# Altium integrated library Altium_WR-TBL_Rising Cage Clamp (rev25a).IntLib: 435 symbols (part 1 of 3) (continued)
## 691214300002
designator J?
WR-TBL Series 2143 Vertical Entry Modular, THT, pitch 3.81mm, 02p; Manufacturer: Wurth Elektronik; Modularity: Yes; Rated Current: 10A; System: Rising Cage Clamp; Working Voltage: 300V; Manufacturer Part Number: 691214300002; Category: Terminal Block; Match Code: WR-TBL; ComponentLink1Description: Website Link; ComponentLink1URL: https://www.we-online.com/redexpert/article/691214300002?ad; ComponentLink2Description: Datasheet Link; ComponentLink2URL: https://www.we-online.com/redexpert/spec/691214300002?ad; Mount: Through Hole; Min Operating Temperature: -30°C; Max Operating Temperature: 120°C; Packaging: Box; Application: Rising Cage Clamp; Number of Pins: 2; Number of Rows: 1; Orientation: Vertical; Pitch: 3.81mm
footprint 691214300002
pins: 1, 2

## 691214300003
designator J?
WR-TBL Series 2143 Vertical Entry Modular, THT, pitch 3.81mm, 03p; Manufacturer: Wurth Elektronik; Modularity: Yes; Rated Current: 10A; System: Rising Cage Clamp; Working Voltage: 300V; Manufacturer Part Number: 691214300003; Category: Terminal Block; Match Code: WR-TBL; ComponentLink1Description: Website Link; ComponentLink1URL: https://www.we-online.com/redexpert/article/691214300003?ad; ComponentLink2Description: Datasheet Link; ComponentLink2URL: https://www.we-online.com/redexpert/spec/691214300003?ad; Mount: Through Hole; Min Operating Temperature: -30°C; Max Operating Temperature: 120°C; Packaging: Box; Application: Rising Cage Clamp; Number of Pins: 3; Number of Rows: 1; Orientation: Vertical; Pitch: 3.81mm
footprint 691214300003
pins: 1, 2, 3

## 691214310002
designator J?
WR-TBL Series 2143 Horizontal Entry Modular, THT, pitch 3.81mm, 02p; Manufacturer: Wurth Elektronik; Modularity: Yes; Rated Current: 10A; System: Rising Cage Clamp; Working Voltage: 300V; Manufacturer Part Number: 691214310002; Category: Terminal Block; Match Code: WR-TBL; ComponentLink1Description: Website Link; ComponentLink1URL: https://www.we-online.com/redexpert/article/691214310002?ad; ComponentLink2Description: Datasheet Link; ComponentLink2URL: https://www.we-online.com/redexpert/spec/691214310002?ad; Mount: Through Hole; Min Operating Temperature: -40°C; Max Operating Temperature: 105°C; Packaging: Box; Application: Rising Cage Clamp; Number of Pins: 2; Number of Rows: 1; Orientation: Horizontal; Pitch: 3.81mm
footprint 691214310002
pins: 1, 2

## 691214310003
designator J?
WR-TBL Series 2143 Horizontal Entry Modular, THT, pitch 3.81mm, 03p; Manufacturer: Wurth Elektronik; Modularity: Yes; Rated Current: 10A; System: Rising Cage Clamp; Working Voltage: 300V; Manufacturer Part Number: 691214310003; Category: Terminal Block; Match Code: WR-TBL; ComponentLink1Description: Website Link; ComponentLink1URL: https://www.we-online.com/redexpert/article/691214310003?ad; ComponentLink2Description: Datasheet Link; ComponentLink2URL: https://www.we-online.com/redexpert/spec/691214310003?ad; Mount: Through Hole; Min Operating Temperature: -40°C; Max Operating Temperature: 105°C; Packaging: Box; Application: Rising Cage Clamp; Number of Pins: 3; Number of Rows: 1; Orientation: Horizontal; Pitch: 3.81mm
footprint 691214310003
pins: 1, 2, 3

## 691214400001
designator J?
WR-TBL Series 2144 Vertical Cable Entry, THT, pitch 7.62mm, 01p; Manufacturer: Wurth Elektronik; Modularity: Yes; Rated Current: 10A; System: Rising Cage Clamp; Working Voltage: 300V; Manufacturer Part Number: 691214400001; Category: Terminal Block; Match Code: WR-TBL; ComponentLink1Description: Website Link; ComponentLink1URL: https://www.we-online.com/redexpert/article/691214400001?ad; ComponentLink2Description: Datasheet Link; ComponentLink2URL: https://www.we-online.com/redexpert/spec/691214400001?ad; Mount: Through Hole; Min Operating Temperature: -30°C; Max Operating Temperature: 120°C; Packaging: Box; Application: Rising Cage Clamp; Number of Pins: 1; Number of Rows: 1; Orientation: Vertical; Pitch: 7.62mm
footprint 691214400001
pins: 1

## 691214400002
designator J?
WR-TBL Series 2144 Vertical Cable Entry, THT, pitch 7.62mm, 02p; Manufacturer: Wurth Elektronik; Modularity: Yes; Rated Current: 10A; System: Rising Cage Clamp; Working Voltage: 300V; Manufacturer Part Number: 691214400002; Category: Terminal Block; Match Code: WR-TBL; ComponentLink1Description: Website Link; ComponentLink1URL: https://www.we-online.com/redexpert/article/691214400002?ad; ComponentLink2Description: Datasheet Link; ComponentLink2URL: https://www.we-online.com/redexpert/spec/691214400002?ad; Mount: Through Hole; Min Operating Temperature: -30°C; Max Operating Temperature: 120°C; Packaging: Box; Application: Rising Cage Clamp; Number of Pins: 2; Number of Rows: 1; Orientation: Vertical; Pitch: 7.62mm
footprint 691214400002
pins: 1, 2

## 691214400101
designator J?
WR-TBL Series 2144 Vertical Cable Entry, THT, pitch 7.62mm, 01p; Manufacturer: Wurth Elektronik; Modularity: Yes; Rated Current: 10A; System: Rising Cage Clamp; Working Voltage: 300V; Manufacturer Part Number: 691214400101; Category: Terminal Block; Match Code: WR-TBL; ComponentLink1Description: Website Link; ComponentLink1URL: https://www.we-online.com/redexpert/article/691214400101?ad; ComponentLink2Description: Datasheet Link; ComponentLink2URL: https://www.we-online.com/redexpert/spec/691214400101?ad; Mount: Through Hole; Min Operating Temperature: -30°C; Max Operating Temperature: 120°C; Packaging: Box; Application: Rising Cage Clamp; Number of Pins: 1; Number of Rows: 1; Orientation: Vertical; Pitch: 7.62mm
footprint 691214400101
pins: 1

## 691214410001
designator J?
WR-TBL Series 2144 Horizontal Entry, THT, pitch 7.62mm, 01p; Manufacturer: Wurth Elektronik; Modularity: Yes; Rated Current: 10A; System: Rising Cage Clamp; Working Voltage: 300V; Manufacturer Part Number: 691214410001; Category: Terminal Block; Match Code: WR-TBL; ComponentLink1Description: Website Link; ComponentLink1URL: https://www.we-online.com/redexpert/article/691214410001?ad; ComponentLink2Description: Datasheet Link; ComponentLink2URL: https://www.we-online.com/redexpert/spec/691214410001?ad; Mount: Through Hole; Min Operating Temperature: -30°C; Max Operating Temperature: 120°C; Packaging: Box; Application: Rising Cage Clamp; Number of Pins: 1; Number of Rows: 1; Orientation: Horizontal; Pitch: 7.62mm
footprint 691214410001
pins: 1

## 691214410002
designator J?
WR-TBL Series 2144 Horizontal Entry, THT, pitch 7.62mm, 02p; Manufacturer: Wurth Elektronik; Modularity: Yes; Rated Current: 10A; System: Rising Cage Clamp; Working Voltage: 300V; Manufacturer Part Number: 691214410002; Category: Terminal Block; Match Code: WR-TBL; ComponentLink1Description: Website Link; ComponentLink1URL: https://www.we-online.com/redexpert/article/691214410002?ad; ComponentLink2Description: Datasheet Link; ComponentLink2URL: https://www.we-online.com/redexpert/spec/691214410002?ad; Mount: Through Hole; Min Operating Temperature: -30°C; Max Operating Temperature: 120°C; Packaging: Box; Application: Rising Cage Clamp; Number of Pins: 2; Number of Rows: 1; Orientation: Horizontal; Pitch: 7.62mm
footprint 691214410002
pins: 1, 2

## 691214410101
designator J?
WR-TBL Series 2144 Horizontal Entry, THT, pitch 7.62mm, 01p; Manufacturer: Wurth Elektronik; Modularity: Yes; Rated Current: 10A; System: Rising Cage Clamp; Working Voltage: 300V; Manufacturer Part Number: 691214410101; Category: Terminal Block; Match Code: WR-TBL; ComponentLink1Description: Website Link; ComponentLink1URL: https://www.we-online.com/redexpert/article/691214410101?ad; ComponentLink2Description: Datasheet Link; ComponentLink2URL: https://www.we-online.com/redexpert/spec/691214410101?ad; Mount: Through Hole; Min Operating Temperature: -30°C; Max Operating Temperature: 120°C; Packaging: Box; Application: Rising Cage Clamp; Number of Pins: 1; Number of Rows: 1; Orientation: Horizontal; Pitch: 7.62mm
footprint 691214410101
pins: 1

## 691215700002
designator J?
WR-TBL Series 2157 Vertical Entry Modular, THT, pitch 5mm, 02p; Manufacturer: Wurth Elektronik; Modularity: Yes; Rated Current: 20A; System: Rising Cage Clamp; Working Voltage: 300V; Manufacturer Part Number: 691215700002; Category: Terminal Block; Match Code: WR-TBL; ComponentLink1Description: Website Link; ComponentLink1URL: https://www.we-online.com/redexpert/article/691215700002?ad; ComponentLink2Description: Datasheet Link; ComponentLink2URL: https://www.we-online.com/redexpert/spec/691215700002?ad; Mount: Through Hole; Min Operating Temperature: -40°C; Max Operating Temperature: 105°C; Packaging: Box; Application: Rising Cage Clamp; Number of Pins: 2; Number of Rows: 1; Orientation: Vertical; Pitch: 5mm
footprint 691215700002
pins: 1, 2

## 691215700003
designator J?
WR-TBL Series 2157 Vertical Entry Modular, THT, pitch 5mm, 03p; Manufacturer: Wurth Elektronik; Modularity: Yes; Rated Current: 20A; System: Rising Cage Clamp; Working Voltage: 300V; Manufacturer Part Number: 691215700003; Category: Terminal Block; Match Code: WR-TBL; ComponentLink1Description: Website Link; ComponentLink1URL: https://www.we-online.com/redexpert/article/691215700003?ad; ComponentLink2Description: Datasheet Link; ComponentLink2URL: https://www.we-online.com/redexpert/spec/691215700003?ad; Mount: Through Hole; Min Operating Temperature: -40°C; Max Operating Temperature: 105°C; Packaging: Box; Application: Rising Cage Clamp; Number of Pins: 3; Number of Rows: 1; Orientation: Vertical; Pitch: 5mm
footprint 691215700003
pins: 1, 2, 3

## 691216400002
designator J?
WR-TBL Series 2164 Vertical Entry, THT, pitch 7.62mm, 02p; Manufacturer: Wurth Elektronik; Modularity: Yes; Rated Current: 14A; System: Rising Cage Clamp; Working Voltage: 300V; Manufacturer Part Number: 691216400002; Category: Terminal Block; Match Code: WR-TBL; ComponentLink1Description: Website Link; ComponentLink1URL: https://www.we-online.com/redexpert/article/691216400002?ad; ComponentLink2Description: Datasheet Link; ComponentLink2URL: https://www.we-online.com/redexpert/spec/691216400002?ad; Mount: Through Hole; Min Operating Temperature: -30°C; Max Operating Temperature: 120°C; Packaging: Box; Application: Rising Cage Clamp; Number of Pins: 2; Number of Rows: 1; Orientation: Vertical; Pitch: 7.62mm
footprint 691216400002
pins: 1, 2

## 691216400003
designator J?
WR-TBL Series 2164 Vertical Entry, THT, pitch 7.62mm, 03p; Manufacturer: Wurth Elektronik; Modularity: Yes; Rated Current: 14A; System: Rising Cage Clamp; Working Voltage: 300V; Manufacturer Part Number: 691216400003; Category: Terminal Block; Match Code: WR-TBL; ComponentLink1Description: Website Link; ComponentLink1URL: https://www.we-online.com/redexpert/article/691216400003?ad; ComponentLink2Description: Datasheet Link; ComponentLink2URL: https://www.we-online.com/redexpert/spec/691216400003?ad; Mount: Through Hole; Min Operating Temperature: -30°C; Max Operating Temperature: 120°C; Packaging: Box; Application: Rising Cage Clamp; Number of Pins: 3; Number of Rows: 1; Orientation: Vertical; Pitch: 7.62mm
footprint 691216400003
pins: 1, 2, 3

## 691216410002
designator J?
WR-TBL Series 2164 Horizontal Entry, THT, pitch 7.62mm, 02p; Manufacturer: Wurth Elektronik; Modularity: Yes; Rated Current: 14A; System: Rising Cage Clamp; Working Voltage: 300V; Manufacturer Part Number: 691216410002; Category: Terminal Block; Match Code: WR-TBL; ComponentLink1Description: Website Link; ComponentLink1URL: https://www.we-online.com/redexpert/article/691216410002?ad; ComponentLink2Description: Datasheet Link; ComponentLink2URL: https://www.we-online.com/redexpert/spec/691216410002?ad; Mount: Through Hole; Min Operating Temperature: -30°C; Max Operating Temperature: 120°C; Packaging: Box; Application: Rising Cage Clamp; Number of Pins: 2; Number of Rows: 1; Orientation: Horizontal; Pitch: 7.62mm
footprint 691216410002
pins: 1, 2

## 691216410003
designator J?
WR-TBL Series 2164 Horizontal Entry, THT, pitch 7.62mm, 03p; Manufacturer: Wurth Elektronik; Modularity: Yes; Rated Current: 14A; System: Rising Cage Clamp; Working Voltage: 300V; Manufacturer Part Number: 691216410003; Category: Terminal Block; Match Code: WR-TBL; ComponentLink1Description: Website Link; ComponentLink1URL: https://www.we-online.com/redexpert/article/691216410003?ad; ComponentLink2Description: Datasheet Link; ComponentLink2URL: https://www.we-online.com/redexpert/spec/691216410003?ad; Mount: Through Hole; Min Operating Temperature: -30°C; Max Operating Temperature: 120°C; Packaging: Box; Application: Rising Cage Clamp; Number of Pins: 3; Number of Rows: 1; Orientation: Horizontal; Pitch: 7.62mm
footprint 691216410003
pins: 1, 2, 3

## 691216510002S
designator J?
WR-TBL Series 2165S Horizontal Entry Modular, THT, pitch 5.08mm, 02p; Manufacturer: Wurth Elektronik; Modularity: Yes; Rated Current: 14A; System: Rising Cage Clamp; Working Voltage: 300V; Manufacturer Part Number: 691216510002S; Category: Terminal Block; Match Code: WR-TBL; ComponentLink1Description: Website Link; ComponentLink1URL: https://www.we-online.com/redexpert/article/691216510002S?ad; ComponentLink2Description: Datasheet Link; ComponentLink2URL: https://www.we-online.com/redexpert/spec/691216510002S?ad; Mount: Through Hole; Min Operating Temperature: -30°C; Max Operating Temperature: 120°C; Packaging: Box; Application: Rising Cage Clamp; Number of Pins: 2; Number of Rows: 1; Orientation: Horizontal; Pitch: 5.08mm
footprint 691216510002S
pins: 1, 2

## 691216510003S
designator J?
WR-TBL Series 2165S Horizontal Entry Modular, THT, pitch 5.08mm, 03p; Manufacturer: Wurth Elektronik; Modularity: Yes; Rated Current: 14A; System: Rising Cage Clamp; Working Voltage: 300V; Manufacturer Part Number: 691216510003S; Category: Terminal Block; Match Code: WR-TBL; ComponentLink1Description: Website Link; ComponentLink1URL: https://www.we-online.com/redexpert/article/691216510003S?ad; ComponentLink2Description: Datasheet Link; ComponentLink2URL: https://www.we-online.com/redexpert/spec/691216510003S?ad; Mount: Through Hole; Min Operating Temperature: -30°C; Max Operating Temperature: 120°C; Packaging: Box; Application: Rising Cage Clamp; Number of Pins: 3; Number of Rows: 1; Orientation: Horizontal; Pitch: 5.08mm
footprint 691216510003S
pins: 1, 2, 3

## 691216600001
designator J?
WR-TBL Series 2166 Vertical Entry, THT, pitch 10.16mm, 01p; Manufacturer: Wurth Elektronik; Modularity: Yes; Rated Current: 14A; System: Rising Cage Clamp; Working Voltage: 300V; Manufacturer Part Number: 691216600001; Category: Terminal Block; Match Code: WR-TBL; ComponentLink1Description: Website Link; ComponentLink1URL: https://www.we-online.com/redexpert/article/691216600001?ad; ComponentLink2Description: Datasheet Link; ComponentLink2URL: https://www.we-online.com/redexpert/spec/691216600001?ad; Mount: Through Hole; Min Operating Temperature: -30°C; Max Operating Temperature: 120°C; Packaging: Box; Application: Rising Cage Clamp; Number of Pins: 1; Number of Rows: 1; Orientation: Vertical; Pitch: 10.16mm
footprint 691216600001
pins: 1

## 691216600002
designator J?
WR-TBL Series 2166 Vertical Entry, THT, pitch 10.16mm, 02p; Manufacturer: Wurth Elektronik; Modularity: Yes; Rated Current: 14A; System: Rising Cage Clamp; Working Voltage: 300V; Manufacturer Part Number: 691216600002; Category: Terminal Block; Match Code: WR-TBL; ComponentLink1Description: Website Link; ComponentLink1URL: https://www.we-online.com/redexpert/article/691216600002?ad; ComponentLink2Description: Datasheet Link; ComponentLink2URL: https://www.we-online.com/redexpert/spec/691216600002?ad; Mount: Through Hole; Min Operating Temperature: -30°C; Max Operating Temperature: 120°C; Packaging: Box; Application: Rising Cage Clamp; Number of Pins: 2; Number of Rows: 1; Orientation: Vertical; Pitch: 10.16mm
footprint 691216600002
pins: 1, 2

## 691216600101
designator J?
WR-TBL Series 2166 Vertical Entry, THT, pitch 10.16mm, 01p; Manufacturer: Wurth Elektronik; Modularity: Yes; Rated Current: 14A; System: Rising Cage Clamp; Working Voltage: 300V; Manufacturer Part Number: 691216600101; Category: Terminal Block; Match Code: WR-TBL; ComponentLink1Description: Website Link; ComponentLink1URL: https://www.we-online.com/redexpert/article/691216600101?ad; ComponentLink2Description: Datasheet Link; ComponentLink2URL: https://www.we-online.com/redexpert/spec/691216600101?ad; Mount: Through Hole; Min Operating Temperature: -30°C; Max Operating Temperature: 120°C; Packaging: Box; Application: Rising Cage Clamp; Number of Pins: 1; Number of Rows: 1; Orientation: Vertical; Pitch: 10.16mm
footprint 691216600101
pins: 1

## 691216610001
designator J?
WR-TBL Series 2166 Horizontal Entry, THT, pitch 10.16mm, 01p; Manufacturer: Wurth Elektronik; Modularity: Yes; Rated Current: 14A; System: Rising Cage Clamp; Working Voltage: 300V; Manufacturer Part Number: 691216610001; Category: Terminal Block; Match Code: WR-TBL; ComponentLink1Description: Website Link; ComponentLink1URL: https://www.we-online.com/redexpert/article/691216610001?ad; ComponentLink2Description: Datasheet Link; ComponentLink2URL: https://www.we-online.com/redexpert/spec/691216610001?ad; Mount: Through Hole; Min Operating Temperature: -30°C; Max Operating Temperature: 120°C; Packaging: Box; Application: Rising Cage Clamp; Number of Pins: 1; Number of Rows: 1; Orientation: Horizontal; Pitch: 10.16mm
footprint 691216610001
pins: 1

## 691216610002
designator J?
WR-TBL Series 2166 Horizontal Entry, THT, pitch 10.16mm, 02p; Manufacturer: Wurth Elektronik; Modularity: Yes; Rated Current: 14A; System: Rising Cage Clamp; Working Voltage: 300V; Manufacturer Part Number: 691216610002; Category: Terminal Block; Match Code: WR-TBL; ComponentLink1Description: Website Link; ComponentLink1URL: https://www.we-online.com/redexpert/article/691216610002?ad; ComponentLink2Description: Datasheet Link; ComponentLink2URL: https://www.we-online.com/redexpert/spec/691216610002?ad; Mount: Through Hole; Min Operating Temperature: -30°C; Max Operating Temperature: 120°C; Packaging: Box; Application: Rising Cage Clamp; Number of Pins: 2; Number of Rows: 1; Orientation: Horizontal; Pitch: 10.16mm
footprint 691216610002
pins: 1, 2

## 691216610101
designator J?
WR-TBL Series 2166 Horizontal Entry, THT, pitch 10.16mm, 01p; Manufacturer: Wurth Elektronik; Modularity: Yes; Rated Current: 14A; System: Rising Cage Clamp; Working Voltage: 300V; Manufacturer Part Number: 691216610101; Category: Terminal Block; Match Code: WR-TBL; ComponentLink1Description: Website Link; ComponentLink1URL: https://www.we-online.com/redexpert/article/691216610101?ad; ComponentLink2Description: Datasheet Link; ComponentLink2URL: https://www.we-online.com/redexpert/spec/691216610101?ad; Mount: Through Hole; Min Operating Temperature: -30°C; Max Operating Temperature: 120°C; Packaging: Box; Application: Rising Cage Clamp; Number of Pins: 1; Number of Rows: 1; Orientation: Horizontal; Pitch: 10.16mm
footprint 691216610101
pins: 1

## 691216700002
designator J?
WR-TBL Series 2167 Vertical Entry Modular, THT, pitch 5mm, 02p; Manufacturer: Wurth Elektronik; Modularity: Yes; Rated Current: 14A; System: Rising Cage Clamp; Working Voltage: 300V; Manufacturer Part Number: 691216700002; Category: Terminal Block; Match Code: WR-TBL; ComponentLink1Description: Website Link; ComponentLink1URL: https://www.we-online.com/redexpert/article/691216700002?ad; ComponentLink2Description: Datasheet Link; ComponentLink2URL: https://www.we-online.com/redexpert/spec/691216700002?ad; Mount: Through Hole; Min Operating Temperature: -30°C; Max Operating Temperature: 120°C; Packaging: Box; Application: Rising Cage Clamp; Number of Pins: 2; Number of Rows: 1; Orientation: Vertical; Pitch: 5mm
footprint 691216700002
pins: 1, 2

## 691216700003
designator J?
WR-TBL Series 2167 Vertical Entry Modular, THT, pitch 5mm, 03p; Manufacturer: Wurth Elektronik; Modularity: Yes; Rated Current: 14A; System: Rising Cage Clamp; Working Voltage: 300V; Manufacturer Part Number: 691216700003; Category: Terminal Block; Match Code: WR-TBL; ComponentLink1Description: Website Link; ComponentLink1URL: https://www.we-online.com/redexpert/article/691216700003?ad; ComponentLink2Description: Datasheet Link; ComponentLink2URL: https://www.we-online.com/redexpert/spec/691216700003?ad; Mount: Through Hole; Min Operating Temperature: -30°C; Max Operating Temperature: 120°C; Packaging: Box; Application: Rising Cage Clamp; Number of Pins: 3; Number of Rows: 1; Orientation: Vertical; Pitch: 5mm
footprint 691216700003
pins: 1, 2, 3

## 691216710002
designator J?
WR-TBL Series 2167 Horizontal Entry Modular, THT, pitch 5mm, 02p; Manufacturer: Wurth Elektronik; Modularity: Yes; Rated Current: 14A; System: Rising Cage Clamp; Working Voltage: 300V; Manufacturer Part Number: 691216710002; Category: Terminal Block; Match Code: WR-TBL; ComponentLink1Description: Website Link; ComponentLink1URL: https://www.we-online.com/redexpert/article/691216710002?ad; ComponentLink2Description: Datasheet Link; ComponentLink2URL: https://www.we-online.com/redexpert/spec/691216710002?ad; Mount: Through Hole; Min Operating Temperature: -30°C; Max Operating Temperature: 120°C; Packaging: Box; Application: Rising Cage Clamp; Number of Pins: 2; Number of Rows: 1; Orientation: Horizontal; Pitch: 5mm
footprint 691216710002
pins: 1, 2

## 691216710003
designator J?
WR-TBL Series 2167 Horizontal Entry Modular, THT, pitch 5mm, 03p; Manufacturer: Wurth Elektronik; Modularity: Yes; Rated Current: 14A; System: Rising Cage Clamp; Working Voltage: 300V; Manufacturer Part Number: 691216710003; Category: Terminal Block; Match Code: WR-TBL; ComponentLink1Description: Website Link; ComponentLink1URL: https://www.we-online.com/redexpert/article/691216710003?ad; ComponentLink2Description: Datasheet Link; ComponentLink2URL: https://www.we-online.com/redexpert/spec/691216710003?ad; Mount: Through Hole; Min Operating Temperature: -30°C; Max Operating Temperature: 120°C; Packaging: Box; Application: Rising Cage Clamp; Number of Pins: 3; Number of Rows: 1; Orientation: Horizontal; Pitch: 5mm
footprint 691216710003
pins: 1, 2, 3

## 691216800001
designator J?
WR-TBL Series 2168 Vertical Entry, THT, pitch 10mm, 01p; Manufacturer: Wurth Elektronik; Modularity: Yes; Rated Current: 14A; System: Rising Cage Clamp; Working Voltage: 300V; Manufacturer Part Number: 691216800001; Category: Terminal Block; Match Code: WR-TBL; ComponentLink1Description: Website Link; ComponentLink1URL: https://www.we-online.com/redexpert/article/691216800001?ad; ComponentLink2Description: Datasheet Link; ComponentLink2URL: https://www.we-online.com/redexpert/spec/691216800001?ad; Mount: Through Hole; Min Operating Temperature: -30°C; Max Operating Temperature: 120°C; Packaging: Box; Application: Rising Cage Clamp; Number of Pins: 1; Number of Rows: 1; Orientation: Vertical; Pitch: 10mm
footprint 691216800001
pins: 1

## 691216800002
designator J?
WR-TBL Series 2168 Vertical Entry, THT, pitch 10mm, 02p; Manufacturer: Wurth Elektronik; Modularity: Yes; Rated Current: 14A; System: Rising Cage Clamp; Working Voltage: 300V; Manufacturer Part Number: 691216800002; Category: Terminal Block; Match Code: WR-TBL; ComponentLink1Description: Website Link; ComponentLink1URL: https://www.we-online.com/redexpert/article/691216800002?ad; ComponentLink2Description: Datasheet Link; ComponentLink2URL: https://www.we-online.com/redexpert/spec/691216800002?ad; Mount: Through Hole; Min Operating Temperature: -30°C; Max Operating Temperature: 120°C; Packaging: Box; Application: Rising Cage Clamp; Number of Pins: 2; Number of Rows: 1; Orientation: Vertical; Pitch: 10mm
footprint 691216800002
pins: 1, 2

## 691216800101
designator J?
WR-TBL Series 2168 Vertical Entry, THT, pitch 10mm, 01p; Manufacturer: Wurth Elektronik; Modularity: Yes; Rated Current: 14A; System: Rising Cage Clamp; Working Voltage: 300V; Manufacturer Part Number: 691216800101; Category: Terminal Block; Match Code: WR-TBL; ComponentLink1Description: Website Link; ComponentLink1URL: https://www.we-online.com/redexpert/article/691216800101?ad; ComponentLink2Description: Datasheet Link; ComponentLink2URL: https://www.we-online.com/redexpert/spec/691216800101?ad; Mount: Through Hole; Min Operating Temperature: -30°C; Max Operating Temperature: 120°C; Packaging: Box; Application: Rising Cage Clamp; Number of Pins: 1; Number of Rows: 1; Orientation: Vertical; Pitch: 10mm
footprint 691216800101
pins: 1

## 691216810002
designator J?
WR-TBL Series 2168 Horizontal Entry Modular, THT, pitch 10mm, 02p; Manufacturer: Wurth Elektronik; Modularity: Yes; Rated Current: 14A; System: Rising Cage Clamp; Working Voltage: 300V; Manufacturer Part Number: 691216810002; Category: Terminal Block; Match Code: WR-TBL; ComponentLink1Description: Website Link; ComponentLink1URL: https://www.we-online.com/redexpert/article/691216810002?ad; ComponentLink2Description: Datasheet Link; ComponentLink2URL: https://www.we-online.com/redexpert/spec/691216810002?ad; Mount: Through Hole; Min Operating Temperature: -30°C; Max Operating Temperature: 120°C; Packaging: Box; Application: Rising Cage Clamp; Number of Pins: 2; Number of Rows: 1; Orientation: Horizontal; Pitch: 10mm
footprint 691216810002
pins: 1, 2

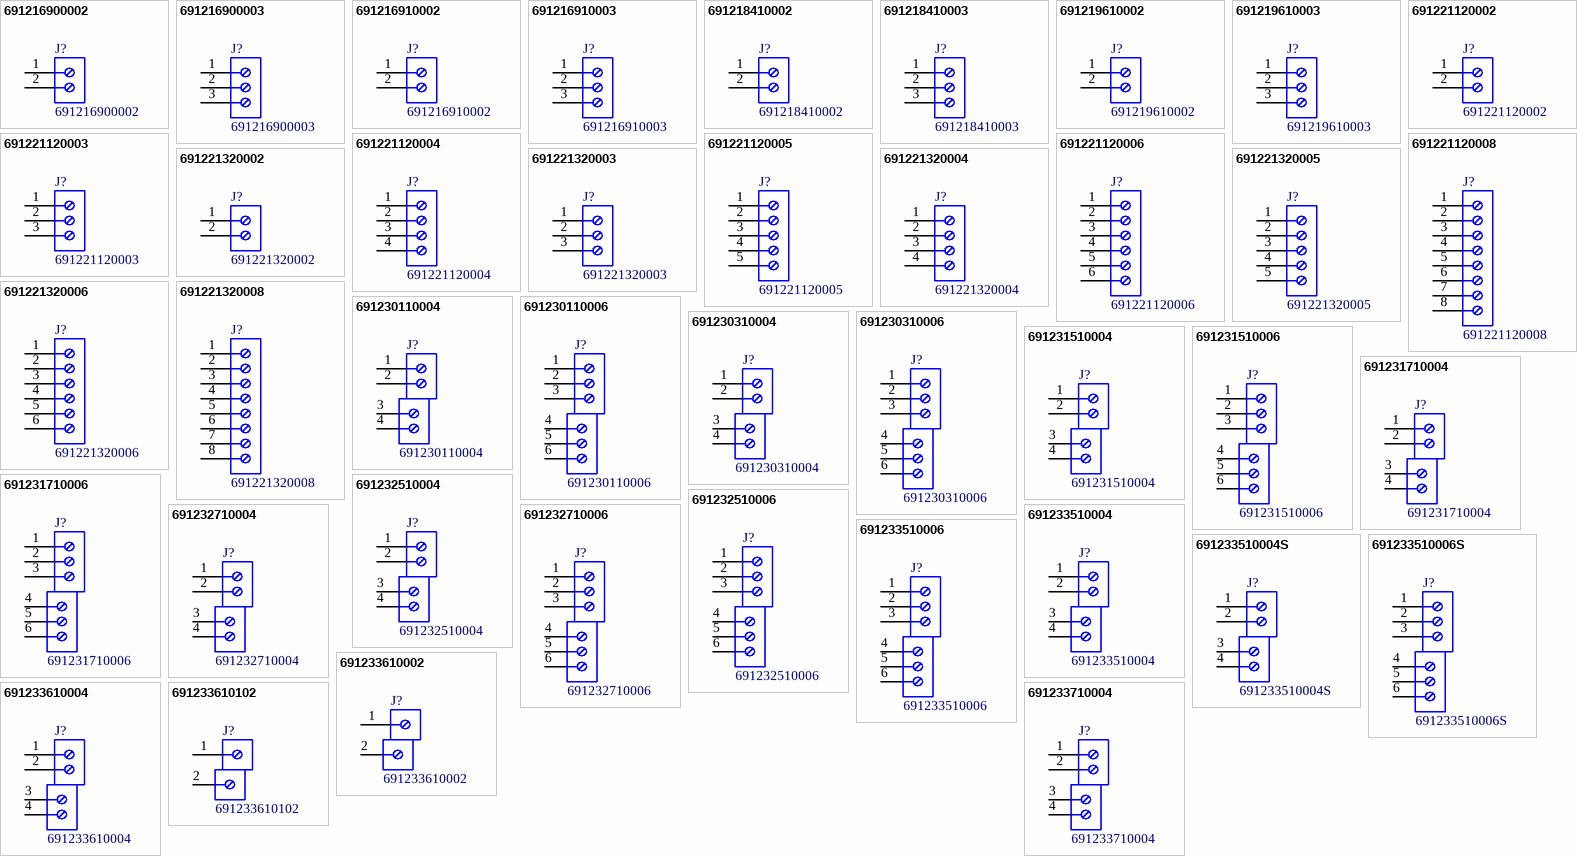
[diagram p2: symbols 691216900002 to 691233710004]

## 691216900002
designator J?
WR-TBL Series 2169 Vertical Entry, THT, pitch 7.5mm, 02p; Manufacturer: Wurth Elektronik; Modularity: Yes; Rated Current: 14A; System: Rising Cage Clamp; Working Voltage: 300V; Manufacturer Part Number: 691216900002; Category: Terminal Block; Match Code: WR-TBL; ComponentLink1Description: Website Link; ComponentLink1URL: https://www.we-online.com/redexpert/article/691216900002?ad; ComponentLink2Description: Datasheet Link; ComponentLink2URL: https://www.we-online.com/redexpert/spec/691216900002?ad; Mount: Through Hole; Min Operating Temperature: -30°C; Max Operating Temperature: 120°C; Packaging: Box; Application: Rising Cage Clamp; Number of Pins: 2; Number of Rows: 1; Orientation: Vertical; Pitch: 7.5mm
footprint 691216900002
pins: 1, 2

## 691216900003
designator J?
WR-TBL Series 2169 Vertical Entry, THT, pitch 7.5mm, 03p; Manufacturer: Wurth Elektronik; Modularity: Yes; Rated Current: 14A; System: Rising Cage Clamp; Working Voltage: 300V; Manufacturer Part Number: 691216900003; Category: Terminal Block; Match Code: WR-TBL; ComponentLink1Description: Website Link; ComponentLink1URL: https://www.we-online.com/redexpert/article/691216900003?ad; ComponentLink2Description: Datasheet Link; ComponentLink2URL: https://www.we-online.com/redexpert/spec/691216900003?ad; Mount: Through Hole; Min Operating Temperature: -30°C; Max Operating Temperature: 120°C; Packaging: Box; Application: Rising Cage Clamp; Number of Pins: 3; Number of Rows: 1; Orientation: Vertical; Pitch: 7.5mm
footprint 691216900003
pins: 1, 2, 3

## 691216910002
designator J?
WR-TBL Series 2169 Horizontal Entry Modular, THT, pitch 7.5mm, 02p; Manufacturer: Wurth Elektronik; Modularity: Yes; Rated Current: 14A; System: Rising Cage Clamp; Working Voltage: 300V; Manufacturer Part Number: 691216910002; Category: Terminal Block; Match Code: WR-TBL; ComponentLink1Description: Website Link; ComponentLink1URL: https://www.we-online.com/redexpert/article/691216910002?ad; ComponentLink2Description: Datasheet Link; ComponentLink2URL: https://www.we-online.com/redexpert/spec/691216910002?ad; Mount: Through Hole; Min Operating Temperature: -30°C; Max Operating Temperature: 120°C; Packaging: Box; Application: Rising Cage Clamp; Number of Pins: 2; Number of Rows: 1; Orientation: Horizontal; Pitch: 7.5mm
footprint 691216910002
pins: 1, 2

## 691216910003
designator J?
WR-TBL Series 2169 Horizontal Entry Modular, THT, pitch 7.5mm, 03p; Manufacturer: Wurth Elektronik; Modularity: Yes; Rated Current: 14A; System: Rising Cage Clamp; Working Voltage: 300V; Manufacturer Part Number: 691216910003; Category: Terminal Block; Match Code: WR-TBL; ComponentLink1Description: Website Link; ComponentLink1URL: https://www.we-online.com/redexpert/article/691216910003?ad; ComponentLink2Description: Datasheet Link; ComponentLink2URL: https://www.we-online.com/redexpert/spec/691216910003?ad; Mount: Through Hole; Min Operating Temperature: -30°C; Max Operating Temperature: 120°C; Packaging: Box; Application: Rising Cage Clamp; Number of Pins: 3; Number of Rows: 1; Orientation: Horizontal; Pitch: 7.5mm
footprint 691216910003
pins: 1, 2, 3

## 691218410002
designator J?
WR-TBL Series 2184 Horizontal Entry Modular, THT, pitch 7.62mm, 02p; Manufacturer: Wurth Elektronik; Modularity: Yes; Rated Current: 30A; System: Rising Cage Clamp; Working Voltage: 300V; Manufacturer Part Number: 691218410002; Category: Terminal Block; Match Code: WR-TBL; ComponentLink1Description: Website Link; ComponentLink1URL: https://www.we-online.com/redexpert/article/691218410002?ad; ComponentLink2Description: Datasheet Link; ComponentLink2URL: https://www.we-online.com/redexpert/spec/691218410002?ad; Mount: Through Hole; Min Operating Temperature: -40°C; Max Operating Temperature: 105°C; Packaging: Box; Application: Rising Cage Clamp; Number of Pins: 2; Number of Rows: 1; Orientation: Horizontal; Pitch: 7.62mm
footprint 691218410002
pins: 1, 2

## 691218410003
designator J?
WR-TBL Series 2184 Horizontal Entry Modular, THT, pitch 7.62mm, 03p; Manufacturer: Wurth Elektronik; Modularity: Yes; Rated Current: 30A; System: Rising Cage Clamp; Working Voltage: 300V; Manufacturer Part Number: 691218410003; Category: Terminal Block; Match Code: WR-TBL; ComponentLink1Description: Website Link; ComponentLink1URL: https://www.we-online.com/redexpert/article/691218410003?ad; ComponentLink2Description: Datasheet Link; ComponentLink2URL: https://www.we-online.com/redexpert/spec/691218410003?ad; Mount: Through Hole; Min Operating Temperature: -40°C; Max Operating Temperature: 105°C; Packaging: Box; Application: Rising Cage Clamp; Number of Pins: 3; Number of Rows: 1; Orientation: Horizontal; Pitch: 7.62mm
footprint 691218410003
pins: 1, 2, 3

## 691219610002
designator J?
WR-TBL Series 2196 Horizontal Entry Modular, THT, pitch 10.16mm, 02p; Manufacturer: Wurth Elektronik; Modularity: Yes; Rated Current: 57A; System: Rising Cage Clamp; Working Voltage: 300V; Manufacturer Part Number: 691219610002; Category: Terminal Block; Match Code: WR-TBL; ComponentLink1Description: Website Link; ComponentLink1URL: https://www.we-online.com/redexpert/article/691219610002?ad; ComponentLink2Description: Datasheet Link; ComponentLink2URL: https://www.we-online.com/redexpert/spec/691219610002?ad; Mount: Through Hole; Min Operating Temperature: -40°C; Max Operating Temperature: 105°C; Packaging: Box; Application: Rising Cage Clamp; Number of Pins: 2; Number of Rows: 1; Orientation: Horizontal; Pitch: 10.16mm
footprint 691219610002
pins: 1, 2

## 691219610003
designator J?
WR-TBL Series 2196 Horizontal Entry Modular, THT, pitch 10.16mm, 03p; Manufacturer: Wurth Elektronik; Modularity: Yes; Rated Current: 57A; System: Rising Cage Clamp; Working Voltage: 300V; Manufacturer Part Number: 691219610003; Category: Terminal Block; Match Code: WR-TBL; ComponentLink1Description: Website Link; ComponentLink1URL: https://www.we-online.com/redexpert/article/691219610003?ad; ComponentLink2Description: Datasheet Link; ComponentLink2URL: https://www.we-online.com/redexpert/spec/691219610003?ad; Mount: Through Hole; Min Operating Temperature: -40°C; Max Operating Temperature: 105°C; Packaging: Box; Application: Rising Cage Clamp; Number of Pins: 3; Number of Rows: 1; Orientation: Horizontal; Pitch: 10.16mm
footprint 691219610003
pins: 1, 2, 3

## 691221120002
designator J?
WR-TBL Series 2211 55° Entry Modular, THT, pitch 3.5mm, 02p; Manufacturer: Wurth Elektronik; Modularity: Yes; Rated Current: 10A; System: Rising Cage Clamp; Working Voltage: 300V; Manufacturer Part Number: 691221120002; Category: Terminal Block; Match Code: WR-TBL; ComponentLink1Description: Website Link; ComponentLink1URL: https://www.we-online.com/redexpert/article/691221120002?ad; ComponentLink2Description: Datasheet Link; ComponentLink2URL: https://www.we-online.com/redexpert/spec/691221120002?ad; Mount: Through Hole; Min Operating Temperature: -40°C; Max Operating Temperature: 105°C; Packaging: Box; Application: Rising Cage Clamp; Number of Pins: 2; Number of Rows: 1; Orientation: 55°; Pitch: 3.5mm
footprint 691221120002
pins: 1, 2

## 691221120003
designator J?
WR-TBL Series 2211 55° Entry Modular, THT, pitch 3.5mm, 03p; Manufacturer: Wurth Elektronik; Modularity: Yes; Rated Current: 10A; System: Rising Cage Clamp; Working Voltage: 300V; Manufacturer Part Number: 691221120003; Category: Terminal Block; Match Code: WR-TBL; ComponentLink1Description: Website Link; ComponentLink1URL: https://www.we-online.com/redexpert/article/691221120003?ad; ComponentLink2Description: Datasheet Link; ComponentLink2URL: https://www.we-online.com/redexpert/spec/691221120003?ad; Mount: Through Hole; Min Operating Temperature: -40°C; Max Operating Temperature: 105°C; Packaging: Box; Application: Rising Cage Clamp; Number of Pins: 3; Number of Rows: 1; Orientation: 55°; Pitch: 3.5mm
footprint 691221120003
pins: 1, 2, 3

## 691221120004
designator J?
WR-TBL Series 2211 55° Entry Modular, THT, pitch 3.5mm, 04p; Manufacturer: Wurth Elektronik; Modularity: Yes; Rated Current: 10A; System: Rising Cage Clamp; Working Voltage: 300V; Manufacturer Part Number: 691221120004; Category: Terminal Block; Match Code: WR-TBL; ComponentLink1Description: Website Link; ComponentLink1URL: https://www.we-online.com/redexpert/article/691221120004?ad; ComponentLink2Description: Datasheet Link; ComponentLink2URL: https://www.we-online.com/redexpert/spec/691221120004?ad; Mount: Through Hole; Min Operating Temperature: -40°C; Max Operating Temperature: 105°C; Packaging: Box; Application: Rising Cage Clamp; Number of Pins: 4; Number of Rows: 1; Orientation: 55°; Pitch: 3.5mm
footprint 691221120004
pins: 1, 2, 3, 4

## 691221120005
designator J?
WR-TBL Series 2211 55° Entry Modular, THT, pitch 3.5mm, 05p; Manufacturer: Wurth Elektronik; Modularity: Yes; Rated Current: 10A; System: Rising Cage Clamp; Working Voltage: 300V; Manufacturer Part Number: 691221120005; Category: Terminal Block; Match Code: WR-TBL; ComponentLink1Description: Website Link; ComponentLink1URL: https://www.we-online.com/redexpert/article/691221120005?ad; ComponentLink2Description: Datasheet Link; ComponentLink2URL: https://www.we-online.com/redexpert/spec/691221120005?ad; Mount: Through Hole; Min Operating Temperature: -40°C; Max Operating Temperature: 105°C; Packaging: Box; Application: Rising Cage Clamp; Number of Pins: 5; Number of Rows: 1; Orientation: 55°; Pitch: 3.5mm
footprint 691221120005
pins: 1, 2, 3, 4, 5

## 691221120006
designator J?
WR-TBL Series 2211 55° Entry Modular, THT, pitch 3.5mm, 06p; Manufacturer: Wurth Elektronik; Modularity: Yes; Rated Current: 10A; System: Rising Cage Clamp; Working Voltage: 300V; Manufacturer Part Number: 691221120006; Category: Terminal Block; Match Code: WR-TBL; ComponentLink1Description: Website Link; ComponentLink1URL: https://www.we-online.com/redexpert/article/691221120006?ad; ComponentLink2Description: Datasheet Link; ComponentLink2URL: https://www.we-online.com/redexpert/spec/691221120006?ad; Mount: Through Hole; Min Operating Temperature: -40°C; Max Operating Temperature: 105°C; Packaging: Box; Application: Rising Cage Clamp; Number of Pins: 6; Number of Rows: 1; Orientation: 55°; Pitch: 3.5mm
footprint 691221120006
pins: 1, 2, 3, 4, 5, 6

## 691221120008
designator J?
WR-TBL Series 2211 55° Entry Modular, THT, pitch 3.5mm, 08p; Manufacturer: Wurth Elektronik; Modularity: Yes; Rated Current: 10A; System: Rising Cage Clamp; Working Voltage: 300V; Manufacturer Part Number: 691221120008; Category: Terminal Block; Match Code: WR-TBL; ComponentLink1Description: Website Link; ComponentLink1URL: https://www.we-online.com/redexpert/article/691221120008?ad; ComponentLink2Description: Datasheet Link; ComponentLink2URL: https://www.we-online.com/redexpert/spec/691221120008?ad; Mount: Through Hole; Min Operating Temperature: -40°C; Max Operating Temperature: 105°C; Packaging: Box; Application: Rising Cage Clamp; Number of Pins: 8; Number of Rows: 1; Orientation: 55°; Pitch: 3.5mm
footprint 691221120008
pins: 1, 2, 3, 4, 5, 6, 7, 8

## 691221320002
designator J?
WR-TBL Series 2213 55° Entry Modular, THT, pitch 3.81mm, 02p; Manufacturer: Wurth Elektronik; Modularity: Yes; Rated Current: 10A; System: Rising Cage Clamp; Working Voltage: 300V; Manufacturer Part Number: 691221320002; Category: Terminal Block; Match Code: WR-TBL; ComponentLink1Description: Website Link; ComponentLink1URL: https://www.we-online.com/redexpert/article/691221320002?ad; ComponentLink2Description: Datasheet Link; ComponentLink2URL: https://www.we-online.com/redexpert/spec/691221320002?ad; Mount: Through Hole; Min Operating Temperature: -40°C; Max Operating Temperature: 105°C; Packaging: Box; Application: Rising Cage Clamp; Number of Pins: 2; Number of Rows: 1; Orientation: 55°; Pitch: 3.81mm
footprint 691221320002
pins: 1, 2

## 691221320003
designator J?
WR-TBL Series 2213 55° Entry Modular, THT, pitch 3.81mm, 03p; Manufacturer: Wurth Elektronik; Modularity: Yes; Rated Current: 10A; System: Rising Cage Clamp; Working Voltage: 300V; Manufacturer Part Number: 691221320003; Category: Terminal Block; Match Code: WR-TBL; ComponentLink1Description: Website Link; ComponentLink1URL: https://www.we-online.com/redexpert/article/691221320003?ad; ComponentLink2Description: Datasheet Link; ComponentLink2URL: https://www.we-online.com/redexpert/spec/691221320003?ad; Mount: Through Hole; Min Operating Temperature: -40°C; Max Operating Temperature: 105°C; Packaging: Box; Application: Rising Cage Clamp; Number of Pins: 3; Number of Rows: 1; Orientation: 55°; Pitch: 3.81mm
footprint 691221320003
pins: 1, 2, 3

## 691221320004
designator J?
WR-TBL Series 2213 55° Entry Modular, THT, pitch 3.81mm, 04p; Manufacturer: Wurth Elektronik; Modularity: Yes; Rated Current: 10A; System: Rising Cage Clamp; Working Voltage: 300V; Manufacturer Part Number: 691221320004; Category: Terminal Block; Match Code: WR-TBL; ComponentLink1Description: Website Link; ComponentLink1URL: https://www.we-online.com/redexpert/article/691221320004?ad; ComponentLink2Description: Datasheet Link; ComponentLink2URL: https://www.we-online.com/redexpert/spec/691221320004?ad; Mount: Through Hole; Min Operating Temperature: -40°C; Max Operating Temperature: 105°C; Packaging: Box; Application: Rising Cage Clamp; Number of Pins: 4; Number of Rows: 1; Orientation: 55°; Pitch: 3.81mm
footprint 691221320004
pins: 1, 2, 3, 4

## 691221320005
designator J?
WR-TBL Series 2213 55° Entry Modular, THT, pitch 3.81mm, 05p; Manufacturer: Wurth Elektronik; Modularity: Yes; Rated Current: 10A; System: Rising Cage Clamp; Working Voltage: 300V; Manufacturer Part Number: 691221320005; Category: Terminal Block; Match Code: WR-TBL; ComponentLink1Description: Website Link; ComponentLink1URL: https://www.we-online.com/redexpert/article/691221320005?ad; ComponentLink2Description: Datasheet Link; ComponentLink2URL: https://www.we-online.com/redexpert/spec/691221320005?ad; Mount: Through Hole; Min Operating Temperature: -40°C; Max Operating Temperature: 105°C; Packaging: Box; Application: Rising Cage Clamp; Number of Pins: 5; Number of Rows: 1; Orientation: 55°; Pitch: 3.81mm
footprint 691221320005
pins: 1, 2, 3, 4, 5

## 691221320006
designator J?
WR-TBL Series 2213 55° Entry Modular, THT, pitch 3.81mm, 06p; Manufacturer: Wurth Elektronik; Modularity: Yes; Rated Current: 10A; System: Rising Cage Clamp; Working Voltage: 300V; Manufacturer Part Number: 691221320006; Category: Terminal Block; Match Code: WR-TBL; ComponentLink1Description: Website Link; ComponentLink1URL: https://www.we-online.com/redexpert/article/691221320006?ad; ComponentLink2Description: Datasheet Link; ComponentLink2URL: https://www.we-online.com/redexpert/spec/691221320006?ad; Mount: Through Hole; Min Operating Temperature: -40°C; Max Operating Temperature: 105°C; Packaging: Box; Application: Rising Cage Clamp; Number of Pins: 6; Number of Rows: 1; Orientation: 55°; Pitch: 3.81mm
footprint 691221320006
pins: 1, 2, 3, 4, 5, 6